# Altium footprint library ref-packages-longpad.PCBLIB: 1527 footprints (part 40 of 103)
Each footprint in its own frame and in the unit in brackets; x right, y up, seen from the top. Pads: shape width x height; smd on the part's side, far side on the other; paste and mask are expansions set on the pad; w line width, h text height; cw(c..) or ccw(c..) is an arc to the next point about the centre after c.
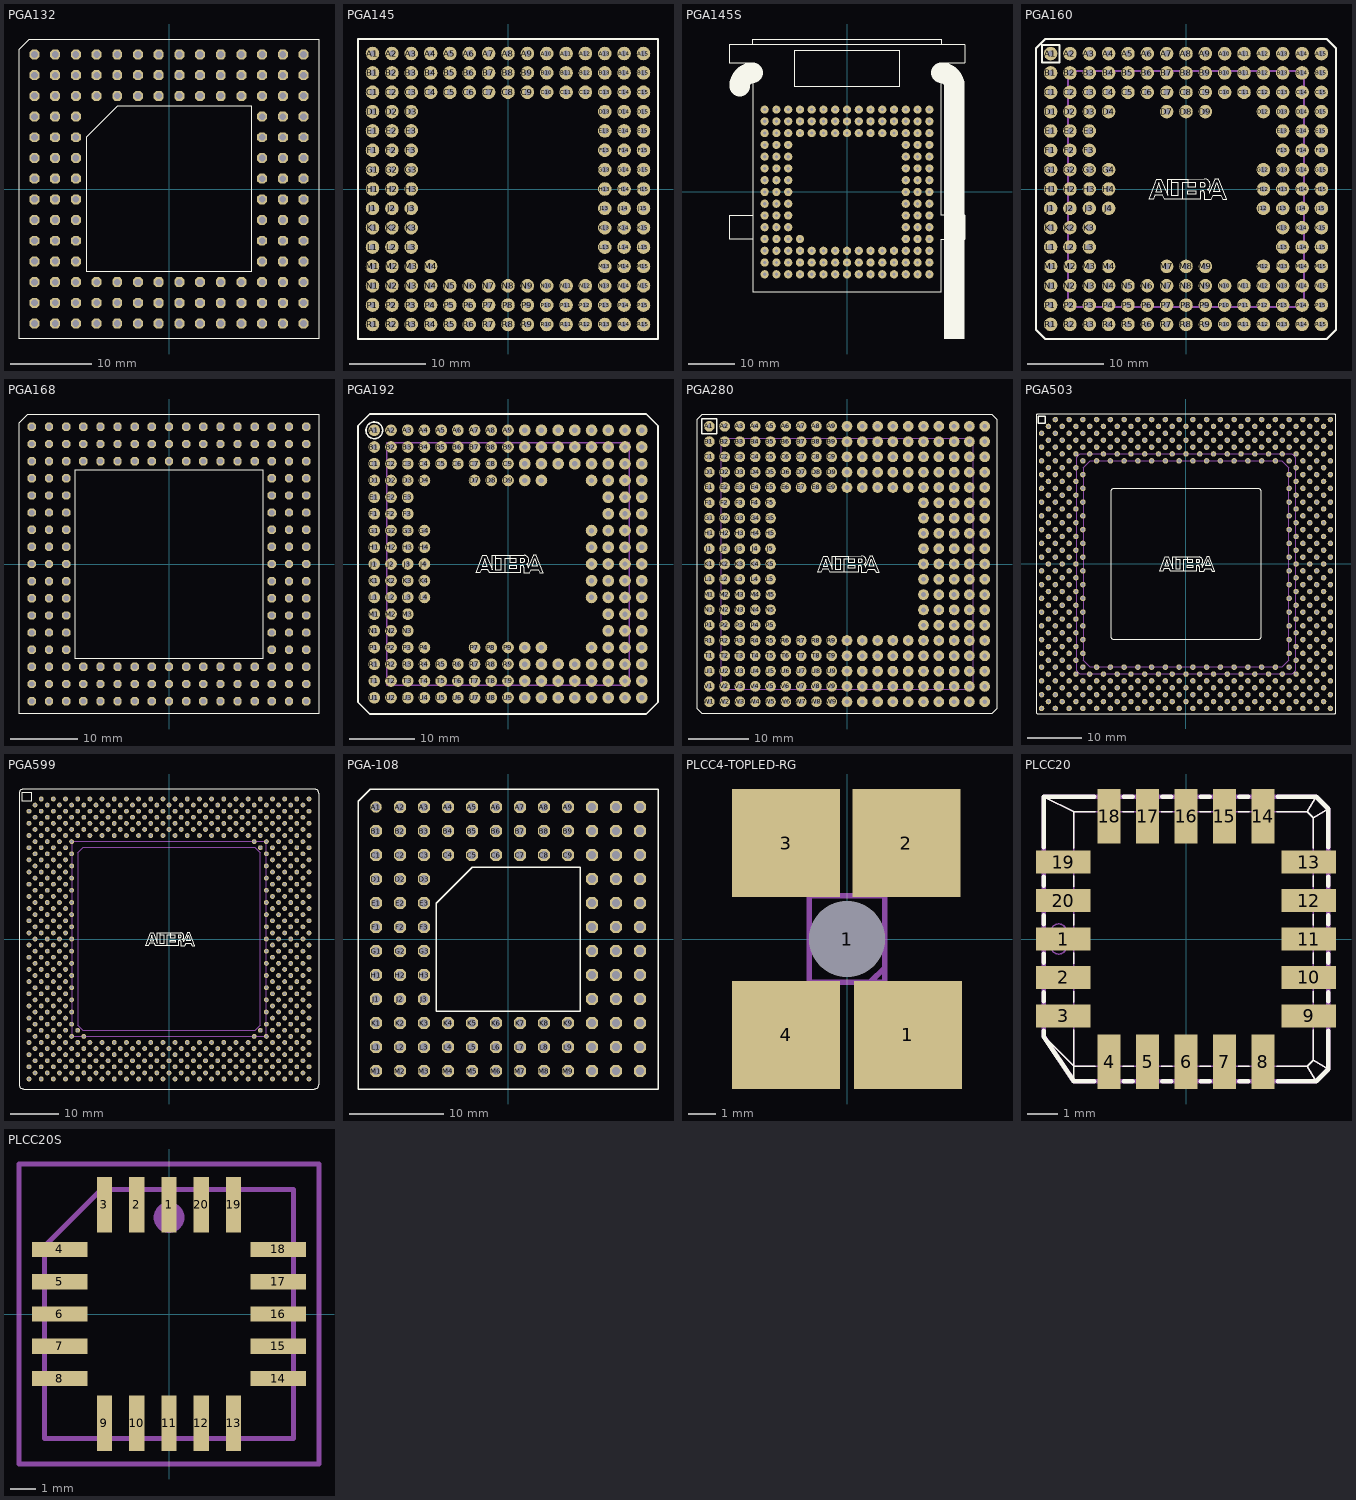
[diagram p39: the footprints below, top view; thin cyan lines are the x and y axes]

## PGA132 [mil]
pads (132):
  oct 48x48 hole 32: A01(-650,650) A02(-550,650) A03(-450,650) A04(-350,650) A05(-250,650) A06(-150,650) A07(-50,650) A08(50,650) A09(150,650) A10(250,650) A11(350,650) A12(450,650) A13(550,650) A14(650,650) B01(-650,550) B02(-550,550) B03(-450,550) B04(-350,550) B05(-250,550) B06(-150,550) B07(-50,550) B08(50,550) B09(150,550) B10(250,550) B11(350,550) B12(450,550) B13(550,550) B14(650,550) C01(-650,450) C02(-550,450) C03(-450,450) C04(-350,450) C05(-250,450) C06(-150,450) C07(-50,450) C08(50,450) C09(150,450) C10(250,450) C11(350,450) C12(450,450) C13(550,450) C14(650,450) D01(-650,350) D02(-550,350) D03(-450,350) D12(450,350) D13(550,350) D14(650,350) E01(-650,250) E02(-550,250) E03(-450,250) E12(450,250) E13(550,250) E14(650,250) F01(-650,150) F02(-550,150) F03(-450,150) F12(450,150) F13(550,150) F14(650,150) G01(-650,50) G02(-550,50) G03(-450,50) G12(450,50) G13(550,50) G14(650,50) H01(-650,-50) H02(-550,-50) H03(-450,-50) H12(450,-50) H13(550,-50) H14(650,-50) J01(-650,-150) J02(-550,-150) J03(-450,-150) J12(450,-150) J13(550,-150) J14(650,-150) K01(-650,-250) K02(-550,-250) K03(-450,-250) K12(450,-250) K13(550,-250) K14(650,-250) L01(-650,-350) L02(-550,-350) L03(-450,-350) L12(450,-350) L13(550,-350) L14(650,-350) M01(-650,-450) M02(-550,-450) M03(-450,-450) M04(-350,-450) M05(-250,-450) M06(-150,-450) M07(-50,-450) M08(50,-450) M09(150,-450) M10(250,-450) M11(350,-450) M12(450,-450) M13(550,-450) M14(650,-450) N01(-650,-550) N02(-550,-550) N03(-450,-550) N04(-350,-550) N05(-250,-550) N06(-150,-550) N07(-50,-550) N08(50,-550) N09(150,-550) N10(250,-550) N11(350,-550) N12(450,-550) N13(550,-550) N14(650,-550) P01(-650,-650) P02(-550,-650) P03(-450,-650) P04(-350,-650) P05(-250,-650) P06(-150,-650) P07(-50,-650) P08(50,-650) P09(150,-650) P10(250,-650) P11(350,-650) P12(450,-650) P13(550,-650) P14(650,-650)
Top Overlay:
  lines w6: -725,-725 725,-725 725,725 -675,725 -725,675 -725,-725 ; -400,-400 400,-400 400,400 -250,400 -400,250 -400,-400

## PGA145 [mil]
pads (145):
  round 70 hole 32: A1(-700,700) A2(-600,700) A3(-500,700) A4(-400,700) A5(-300,700) A6(-200,700) A7(-100,700) A8(0,700) A9(100,700) A10(200,700) A11(300,700) A12(400,700) A13(500,700) A14(600,700) A15(700,700) B1(-700,600) B2(-600,600) B3(-500,600) B4(-400,600) B5(-300,600) B6(-200,600) B7(-100,600) B8(0,600) B9(100,600) B10(200,600) B11(300,600) B12(400,600) B13(500,600) B14(600,600) B15(700,600) C1(-700,500) C2(-600,500) C3(-500,500) C4(-400,500) C5(-300,500) C6(-200,500) C7(-100,500) C8(0,500) C9(100,500) C10(200,500) C11(300,500) C12(400,500) C13(500,500) C14(600,500) C15(700,500) D1(-700,400) D2(-600,400) D3(-500,400) D13(500,400) D14(600,400) D15(700,400) E1(-700,300) E2(-600,300) E3(-500,300) E13(500,300) E14(600,300) E15(700,300) F1(-700,200) F2(-600,200) F3(-500,200) F13(500,200) F14(600,200) F15(700,200) G1(-700,100) G2(-600,100) G3(-500,100) G13(500,100) G14(600,100) G15(700,100) H1(-700,0) H2(-600,0) H3(-500,0) H13(500,0) H14(600,0) H15(700,0) J1(-700,-100) J2(-600,-100) J3(-500,-100) J13(500,-100) J14(600,-100) J15(700,-100) K1(-700,-200) K2(-600,-200) K3(-500,-200) K13(500,-200) K14(600,-200) K15(700,-200) L1(-700,-300) L2(-600,-300) L3(-500,-300) L13(500,-300) L14(600,-300) L15(700,-300) M1(-700,-400) M2(-600,-400) M3(-500,-400) M4(-400,-400) M13(500,-400) M14(600,-400) M15(700,-400) N1(-700,-500) N2(-600,-500) N3(-500,-500) N4(-400,-500) N5(-300,-500) N6(-200,-500) N7(-100,-500) N8(0,-500) N9(100,-500) N10(200,-500) N11(300,-500) N12(400,-500) N13(500,-500) N14(600,-500) N15(700,-500) P1(-700,-600) P2(-600,-600) P3(-500,-600) P4(-400,-600) P5(-300,-600) P6(-200,-600) P7(-100,-600) P8(0,-600) P9(100,-600) P10(200,-600) P11(300,-600) P12(400,-600) P13(500,-600) P14(600,-600) P15(700,-600) R1(-700,-700) R2(-600,-700) R3(-500,-700) R4(-400,-700) R5(-300,-700) R6(-200,-700) R7(-100,-700) R8(0,-700) R9(100,-700) R10(200,-700) R11(300,-700) R12(400,-700) R13(500,-700) R14(600,-700) R15(700,-700)
Top Overlay:
  lines w10: -775,-775 775,-775 775,775 -775,775 -775,-775

## PGA145S [mil]
pads (145):
  round 70 hole 27.56: A1(-700,700) A2(-600,700) A3(-500,700) A4(-400,700) A5(-300,700) A6(-200,700) A7(-100,700) A8(0,700) A9(100,700) A10(200,700) A11(300,700) A12(400,700) A13(500,700) A14(600,700) A15(700,700) B1(-700,600) B2(-600,600) B3(-500,600) B4(-400,600) B5(-300,600) B6(-200,600) B7(-100,600) B8(0,600) B9(100,600) B10(200,600) B11(300,600) B12(400,600) B13(500,600) B14(600,600) B15(700,600) C1(-700,500) C2(-600,500) C3(-500,500) C4(-400,500) C5(-300,500) C6(-200,500) C7(-100,500) C8(0,500) C9(100,500) C10(200,500) C11(300,500) C12(400,500) C13(500,500) C14(600,500) C15(700,500) D1(-700,400) D2(-600,400) D3(-500,400) D13(500,400) D14(600,400) D15(700,400) E1(-700,300) E2(-600,300) E3(-500,300) E13(500,300) E14(600,300) E15(700,300) F1(-700,200) F2(-600,200) F3(-500,200) F13(500,200) F14(600,200) F15(700,200) G1(-700,100) G2(-600,100) G3(-500,100) G13(500,100) G14(600,100) G15(700,100) H1(-700,0) H2(-600,0) H3(-500,0) H13(500,0) H14(600,0) H15(700,0) J1(-700,-100) J2(-600,-100) J3(-500,-100) J13(500,-100) J14(600,-100) J15(700,-100) K1(-700,-200) K2(-600,-200) K3(-500,-200) K13(500,-200) K14(600,-200) K15(700,-200) L1(-700,-300) L2(-600,-300) L3(-500,-300) L13(500,-300) L14(600,-300) L15(700,-300) M1(-700,-400) M2(-600,-400) M3(-500,-400) M4(-400,-400) M13(500,-400) M14(600,-400) M15(700,-400) N1(-700,-500) N2(-600,-500) N3(-500,-500) N4(-400,-500) N5(-300,-500) N6(-200,-500) N7(-100,-500) N8(0,-500) N9(100,-500) N10(200,-500) N11(300,-500) N12(400,-500) N13(500,-500) N14(600,-500) N15(700,-500) P1(-700,-600) P2(-600,-600) P3(-500,-600) P4(-400,-600) P5(-300,-600) P6(-200,-600) P7(-100,-600) P8(0,-600) P9(100,-600) P10(200,-600) P11(300,-600) P12(400,-600) P13(500,-600) P14(600,-600) P15(700,-600) R1(-700,-700) R2(-600,-700) R3(-500,-700) R4(-400,-700) R5(-300,-700) R6(-200,-700) R7(-100,-700) R8(0,-700) R9(100,-700) R10(200,-700) R11(300,-700) R12(400,-700) R13(500,-700) R14(600,-700) R15(700,-700)
Top Overlay:
  rectangle: 825,-1250 1000,925
  lines w10: -800,-400 -1000,-400 -1000,-200 -800,-200 ; -800,-400 -800,-850 800,-850 800,-400 1000,-400 1000,-200 800,-200 800,1012.5 800,1100 1000,1100 1000,1250 800,1250 ; -800,-400 -800,-200 ; -800,-200 -800,1012.5 -800,1100 -1000,1100 -1000,1250 -800,1250 ; -800,1250 800,1250 ; -800,1250 -800,1300 800,1300 800,1250 ; -450,900 -450,1200 450,1200 450,900 -450,900
  lines w175: -912.5,900 cw(c-800,900) -800,1012.5 ; 800,1012.5 cw(c800,900) 912.5,900

## PGA160 [mil]
pads (160):
  round 70 hole 32: A1(-700,700) A2(-600,700) A3(-500,700) A4(-400,700) A5(-300,700) A6(-200,700) A7(-100,700) A8(0,700) A9(100,700) A10(200,700) A11(300,700) A12(400,700) A13(500,700) A14(600,700) A15(700,700) B1(-700,600) B2(-600,600) B3(-500,600) B4(-400,600) B5(-300,600) B6(-200,600) B7(-100,600) B8(0,600) B9(100,600) B10(200,600) B11(300,600) B12(400,600) B13(500,600) B14(600,600) B15(700,600) C1(-700,500) C2(-600,500) C3(-500,500) C4(-400,500) C5(-300,500) C6(-200,500) C7(-100,500) C8(0,500) C9(100,500) C10(200,500) C11(300,500) C12(400,500) C13(500,500) C14(600,500) C15(700,500) D1(-700,400) D2(-600,400) D3(-500,400) D4(-400,400) D7(-100,400) D8(0,400) D9(100,400) D12(400,400) D13(500,400) D14(600,400) D15(700,400) E1(-700,300) E2(-600,300) E3(-500,300) E13(500,300) E14(600,300) E15(700,300) F1(-700,200) F2(-600,200) F3(-500,200) F13(500,200) F14(600,200) F15(700,200) G1(-700,100) G2(-600,100) G3(-500,100) G4(-400,100) G12(400,100) G13(500,100) G14(600,100) G15(700,100) H1(-700,0) H2(-600,0) H3(-500,0) H4(-400,0) H12(400,0) H13(500,0) H14(600,0) H15(700,0) J1(-700,-100) J2(-600,-100) J3(-500,-100) J4(-400,-100) J12(400,-100) J13(500,-100) J14(600,-100) J15(700,-100) K1(-700,-200) K2(-600,-200) K3(-500,-200) K13(500,-200) K14(600,-200) K15(700,-200) L1(-700,-300) L2(-600,-300) L3(-500,-300) L13(500,-300) L14(600,-300) L15(700,-300) M1(-700,-400) M2(-600,-400) M3(-500,-400) M4(-400,-400) M7(-100,-400) M8(0,-400) M9(100,-400) M12(400,-400) M13(500,-400) M14(600,-400) M15(700,-400) N1(-700,-500) N2(-600,-500) N3(-500,-500) N4(-400,-500) N5(-300,-500) N6(-200,-500) N7(-100,-500) N8(0,-500) N9(100,-500) N10(200,-500) N11(300,-500) N12(400,-500) N13(500,-500) N14(600,-500) N15(700,-500) P1(-700,-600) P2(-600,-600) P3(-500,-600) P4(-400,-600) P5(-300,-600) P6(-200,-600) P7(-100,-600) P8(0,-600) P9(100,-600) P10(200,-600) P11(300,-600) P12(400,-600) P13(500,-600) P14(600,-600) P15(700,-600) R1(-700,-700) R2(-600,-700) R3(-500,-700) R4(-400,-700) R5(-300,-700) R6(-200,-700) R7(-100,-700) R8(0,-700) R9(100,-700) R10(200,-700) R11(300,-700) R12(400,-700) R13(500,-700) R14(600,-700) R15(700,-700)
Top Overlay:
  lines w6: -15.32,-53.43 74.69,-53.43 74.69,-8.43 84.69,-8.43 cw(c84.69,-18.43) 94.69,-18.43 94.69,-53.43 129.69,-53.43 139.69,-33.43 179.69,-33.43 189.69,-53.43 209.69,-53.43 169.69,51.57 149.69,51.57 119.69,-18.43 ; 112.37,-2.09 cw(c104.87,-18.33) 122.36,-22.09 ; 112.58,-2.65 ccw(c95.08,22.13) 97.58,52.36 9.69,51.57 ; -75.32,31.57 -75.32,51.57 ; -75.32,31.57 -75.32,-33.43 -40.32,-33.43 -40.32,31.57 -75.32,31.57 ; -75.32,51.57 -95.32,51.57 -95.32,-33.43 -130.32,51.57 -150.32,51.57 -190.32,-53.43 -170.32,-53.43 -160.32,-33.43 -120.32,-33.43 -110.32,-53.43 -20.32,-53.43 -20.32,31.57 9.69,31.57 ; -75.32,51.57 9.69,51.57 ; 9.69,31.57 9.69,51.57 ; 9.69,31.57 9.69,11.57 49.69,11.57 49.69,31.57 9.69,31.57 ; -155.32,-13.43 -140.32,31.57 -125.32,-13.43 -155.32,-13.43 ; 9.69,-28.43 49.69,-28.43 49.69,-8.43 9.69,-8.43 9.69,-28.43 ; 74.69,11.57 74.69,31.57 89.69,31.57 cw(c89.69,21.57) 89.69,11.57 74.69,11.57 ; 144.69,-13.43 174.69,-13.43 159.69,31.57 144.69,-13.43
  lines w10: -775.59,-728.66 -728.66,-775.59 728.66,-775.59 775.59,-728.66 775.59,728.66 728.66,775.59 -728.66,775.59 -775.59,728.66 -775.59,-728.66 ; -745,655 -655,655 -655,745 -745,745 -745,655
Mechanical 16:
  lines w10: -610.24,-610.24 610.24,-610.24 610.24,610.24 -610.24,610.24 -610.24,-610.24
  text "PGA160" at -110.63,-128.74 h49.6

## PGA168 [mil]
pads (168):
  oct 48x48 hole 32: A01(-800,800) A02(-700,800) A03(-600,800) A04(-500,800) A05(-400,800) A06(-300,800) A07(-200,800) A08(-100,800) A09(0,800) A10(100,800) A11(200,800) A12(300,800) A13(400,800) A14(500,800) A15(600,800) A16(700,800) A17(800,800) B01(-800,700) B02(-700,700) B03(-600,700) B04(-500,700) B05(-400,700) B06(-300,700) B07(-200,700) B08(-100,700) B09(0,700) B10(100,700) B11(200,700) B12(300,700) B13(400,700) B14(500,700) B15(600,700) B16(700,700) B17(800,700) C01(-800,600) C02(-700,600) C03(-600,600) C04(-500,600) C05(-400,600) C06(-300,600) C07(-200,600) C08(-100,600) C09(0,600) C10(100,600) C11(200,600) C12(300,600) C13(400,600) C14(500,600) C15(600,600) C16(700,600) C17(800,600) D01(-800,500) D02(-700,500) D03(-600,500) D15(600,500) D16(700,500) D17(800,500) E01(-800,400) E02(-700,400) E03(-600,400) E15(600,400) E16(700,400) E17(800,400) F01(-800,300) F02(-700,300) F03(-600,300) F15(600,300) F16(700,300) F17(800,300) G01(-800,200) G02(-700,200) G03(-600,200) G15(600,200) G16(700,200) G17(800,200) H01(-800,100) H02(-700,100) H03(-600,100) H15(600,100) H16(700,100) H17(800,100) J01(-800,0) J02(-700,0) J03(-600,0) J15(600,0) J16(700,0) J17(800,0) K01(-800,-100) K02(-700,-100) K03(-600,-100) K15(600,-100) K16(700,-100) K17(800,-100) L01(-800,-200) L02(-700,-200) L03(-600,-200) L15(600,-200) L16(700,-200) L17(800,-200) M01(-800,-300) M02(-700,-300) M03(-600,-300) M15(600,-300) M16(700,-300) M17(800,-300) N01(-800,-400) N02(-700,-400) N03(-600,-400) N15(600,-400) N16(700,-400) N17(800,-400) P01(-800,-500) P02(-700,-500) P03(-600,-500) P15(600,-500) P16(700,-500) P17(800,-500) Q01(-800,-600) Q02(-700,-600) Q03(-600,-600) Q04(-500,-600) Q05(-400,-600) Q06(-300,-600) Q07(-200,-600) Q08(-100,-600) Q09(0,-600) Q10(100,-600) Q11(200,-600) Q12(300,-600) Q13(400,-600) Q14(500,-600) Q15(600,-600) Q16(700,-600) Q17(800,-600) R01(-800,-700) R02(-700,-700) R03(-600,-700) R04(-500,-700) R05(-400,-700) R06(-300,-700) R07(-200,-700) R08(-100,-700) R09(0,-700) R10(100,-700) R11(200,-700) R12(300,-700) R13(400,-700) R14(500,-700) R15(600,-700) R16(700,-700) R17(800,-700) S01(-800,-800) S02(-700,-800) S03(-600,-800) S04(-500,-800) S05(-400,-800) S06(-300,-800) S07(-200,-800) S08(-100,-800) S09(0,-800) S10(100,-800) S11(200,-800) S12(300,-800) S13(400,-800) S14(500,-800) S15(600,-800) S16(700,-800) S17(800,-800)
Top Overlay:
  lines w6: -875,-875 875,-875 875,875 -825,875 -875,825 -875,-875 ; -550,-550 550,-550 550,550 -550,550 -550,-550

## PGA192 [mil]
pads (192):
  round 70 hole 32: A1(-800,800) A2(-700,800) A3(-600,800) A4(-500,800) A5(-400,800) A6(-300,800) A7(-200,800) A8(-100,800) A9(0,800) A10(100,800) A11(200,800) A12(300,800) A13(400,800) A14(500,800) A15(600,800) A16(700,800) A17(800,800) B1(-800,700) B2(-700,700) B3(-600,700) B4(-500,700) B5(-400,700) B6(-300,700) B7(-200,700) B8(-100,700) B9(0,700) B10(100,700) B11(200,700) B12(300,700) B13(400,700) B14(500,700) B15(600,700) B16(700,700) B17(800,700) C1(-800,600) C2(-700,600) C3(-600,600) C4(-500,600) C5(-400,600) C6(-300,600) C7(-200,600) C8(-100,600) C9(0,600) C10(100,600) C11(200,600) C12(300,600) C13(400,600) C14(500,600) C15(600,600) C16(700,600) C17(800,600) D1(-800,500) D2(-700,500) D3(-600,500) D4(-500,500) D7(-200,500) D8(-100,500) D9(0,500) D10(100,500) D11(200,500) D14(500,500) D15(600,500) D16(700,500) D17(800,500) E1(-800,400) E2(-700,400) E3(-600,400) E15(600,400) E16(700,400) E17(800,400) F1(-800,300) F2(-700,300) F3(-600,300) F15(600,300) F16(700,300) F17(800,300) G1(-800,200) G2(-700,200) G3(-600,200) G4(-500,200) G14(500,200) G15(600,200) G16(700,200) G17(800,200) H1(-800,100) H2(-700,100) H3(-600,100) H4(-500,100) H14(500,100) H15(600,100) H16(700,100) H17(800,100) J1(-800,0) J2(-700,0) J3(-600,0) J4(-500,0) J14(500,0) J15(600,0) J16(700,0) J17(800,0) K1(-800,-100) K2(-700,-100) K3(-600,-100) K4(-500,-100) K14(500,-100) K15(600,-100) K16(700,-100) K17(800,-100) L1(-800,-200) L2(-700,-200) L3(-600,-200) L4(-500,-200) L14(500,-200) L15(600,-200) L16(700,-200) L17(800,-200) M1(-800,-300) M2(-700,-300) M3(-600,-300) M15(600,-300) M16(700,-300) M17(800,-300) N1(-800,-400) N2(-700,-400) N3(-600,-400) N15(600,-400) N16(700,-400) N17(800,-400) P1(-800,-500) P2(-700,-500) P3(-600,-500) P4(-500,-500) P7(-200,-500) P8(-100,-500) P9(0,-500) P10(100,-500) P11(200,-500) P14(500,-500) P15(600,-500) P16(700,-500) P17(800,-500) R1(-800,-600) R2(-700,-600) R3(-600,-600) R4(-500,-600) R5(-400,-600) R6(-300,-600) R7(-200,-600) R8(-100,-600) R9(0,-600) R10(100,-600) R11(200,-600) R12(300,-600) R13(400,-600) R14(500,-600) R15(600,-600) R16(700,-600) R17(800,-600) T1(-800,-700) T2(-700,-700) T3(-600,-700) T4(-500,-700) T5(-400,-700) T6(-300,-700) T7(-200,-700) T8(-100,-700) T9(0,-700) T10(100,-700) T11(200,-700) T12(300,-700) T13(400,-700) T14(500,-700) T15(600,-700) T16(700,-700) T17(800,-700) U1(-800,-800) U2(-700,-800) U3(-600,-800) U4(-500,-800) U5(-400,-800) U6(-300,-800) U7(-200,-800) U8(-100,-800) U9(0,-800) U10(100,-800) U11(200,-800) U12(300,-800) U13(400,-800) U14(500,-800) U15(600,-800) U16(700,-800) U17(800,-800)
Top Overlay:
  circle w10: c-800,800 r50
  lines w6: -15.32,-53.43 74.69,-53.43 74.69,-8.43 84.69,-8.43 cw(c84.69,-18.43) 94.69,-18.43 94.69,-53.43 129.69,-53.43 139.69,-33.43 179.69,-33.43 189.69,-53.43 209.69,-53.43 169.69,51.57 149.69,51.57 119.69,-18.43 ; 112.37,-2.09 cw(c104.87,-18.33) 122.36,-22.09 ; 112.58,-2.65 ccw(c95.08,22.13) 97.58,52.36 9.69,51.57 ; -75.32,31.57 -75.32,51.57 ; -75.32,31.57 -75.32,-33.43 -40.32,-33.43 -40.32,31.57 -75.32,31.57 ; -75.32,51.57 -95.32,51.57 -95.32,-33.43 -130.32,51.57 -150.32,51.57 -190.32,-53.43 -170.32,-53.43 -160.32,-33.43 -120.32,-33.43 -110.32,-53.43 -20.32,-53.43 -20.32,31.57 9.69,31.57 ; -75.32,51.57 9.69,51.57 ; 9.69,31.57 9.69,51.57 ; 9.69,31.57 9.69,11.57 49.69,11.57 49.69,31.57 9.69,31.57 ; -155.32,-13.43 -140.32,31.57 -125.32,-13.43 -155.32,-13.43 ; 9.69,-28.43 49.69,-28.43 49.69,-8.43 9.69,-8.43 9.69,-28.43 ; 74.69,11.57 74.69,31.57 89.69,31.57 cw(c89.69,21.57) 89.69,11.57 74.69,11.57 ; 144.69,-13.43 174.69,-13.43 159.69,31.57 144.69,-13.43
  lines w10: -897.64,-826.77 -826.77,-897.64 826.77,-897.64 897.64,-826.77 897.64,826.77 826.77,897.64 -826.77,897.64 -897.64,826.77 -897.64,-826.77
Mechanical 16:
  lines w10: -725,-725 -725,725 725,725 725,-725 -725,-725
  text "PGA192" at -110.63,-128.74 h49.6

## PGA280 [mil]
pads (280):
  round 70 hole 32: A1(-900,900) A2(-800,900) A3(-700,900) A4(-600,900) A5(-500,900) A6(-400,900) A7(-300,900) A8(-200,900) A9(-100,900) A10(0,900) A11(100,900) A12(200,900) A13(300,900) A14(400,900) A15(500,900) A16(600,900) A17(700,900) A18(800,900) A19(900,900) B1(-900,800) B2(-800,800) B3(-700,800) B4(-600,800) B5(-500,800) B6(-400,800) B7(-300,800) B8(-200,800) B9(-100,800) B10(0,800) B11(100,800) B12(200,800) B13(300,800) B14(400,800) B15(500,800) B16(600,800) B17(700,800) B18(800,800) B19(900,800) C1(-900,700) C2(-800,700) C3(-700,700) C4(-600,700) C5(-500,700) C6(-400,700) C7(-300,700) C8(-200,700) C9(-100,700) C10(0,700) C11(100,700) C12(200,700) C13(300,700) C14(400,700) C15(500,700) C16(600,700) C17(700,700) C18(800,700) C19(900,700) D1(-900,600) D2(-800,600) D3(-700,600) D4(-600,600) D5(-500,600) D6(-400,600) D7(-300,600) D8(-200,600) D9(-100,600) D10(0,600) D11(100,600) D12(200,600) D13(300,600) D14(400,600) D15(500,600) D16(600,600) D17(700,600) D18(800,600) D19(900,600) E1(-900,500) E2(-800,500) E3(-700,500) E4(-600,500) E5(-500,500) E6(-400,500) E7(-300,500) E8(-200,500) E9(-100,500) E10(0,500) E11(100,500) E12(200,500) E13(300,500) E14(400,500) E15(500,500) E16(600,500) E17(700,500) E18(800,500) E19(900,500) F1(-900,400) F2(-800,400) F3(-700,400) F4(-600,400) F5(-500,400) F15(500,400) F16(600,400) F17(700,400) F18(800,400) F19(900,400) G1(-900,300) G2(-800,300) G3(-700,300) G4(-600,300) G5(-500,300) G15(500,300) G16(600,300) G17(700,300) G18(800,300) G19(900,300) H1(-900,200) H2(-800,200) H3(-700,200) H4(-600,200) H5(-500,200) H15(500,200) H16(600,200) H17(700,200) H18(800,200) H19(900,200) J1(-900,100) J2(-800,100) J3(-700,100) J4(-600,100) J5(-500,100) J15(500,100) J16(600,100) J17(700,100) J18(800,100) J19(900,100) K1(-900,0) K2(-800,0) K3(-700,0) K4(-600,0) K5(-500,0) K15(500,0) K16(600,0) K17(700,0) K18(800,0) K19(900,0) L1(-900,-100) L2(-800,-100) L3(-700,-100) L4(-600,-100) L5(-500,-100) L15(500,-100) L16(600,-100) L17(700,-100) L18(800,-100) L19(900,-100) M1(-900,-200) M2(-800,-200) M3(-700,-200) M4(-600,-200) M5(-500,-200) M15(500,-200) M16(600,-200) M17(700,-200) M18(800,-200) M19(900,-200) N1(-900,-300) N2(-800,-300) N3(-700,-300) N4(-600,-300) N5(-500,-300) N15(500,-300) N16(600,-300) N17(700,-300) N18(800,-300) N19(900,-300) P1(-900,-400) P2(-800,-400) P3(-700,-400) P4(-600,-400) P5(-500,-400) P15(500,-400) P16(600,-400) P17(700,-400) P18(800,-400) P19(900,-400) R1(-900,-500) R2(-800,-500) R3(-700,-500) R4(-600,-500) R5(-500,-500) R6(-400,-500) R7(-300,-500) R8(-200,-500) R9(-100,-500) R10(0,-500) R11(100,-500) R12(200,-500) R13(300,-500) R14(400,-500) R15(500,-500) R16(600,-500) R17(700,-500) R18(800,-500) R19(900,-500) T1(-900,-600) T2(-800,-600) T3(-700,-600) T4(-600,-600) T5(-500,-600) T6(-400,-600) T7(-300,-600) T8(-200,-600) T9(-100,-600) T10(0,-600) T11(100,-600) T12(200,-600) T13(300,-600) T14(400,-600) T15(500,-600) T16(600,-600) T17(700,-600) T18(800,-600) T19(900,-600) U1(-900,-700) U2(-800,-700) U3(-700,-700) U4(-600,-700) U5(-500,-700) U6(-400,-700) U7(-300,-700) U8(-200,-700) U9(-100,-700) U10(0,-700) U11(100,-700) U12(200,-700) U13(300,-700) U14(400,-700) U15(500,-700) U16(600,-700) U17(700,-700) U18(800,-700) U19(900,-700) V1(-900,-800) V2(-800,-800) V3(-700,-800) V4(-600,-800) V5(-500,-800) V6(-400,-800) V7(-300,-800) V8(-200,-800) V9(-100,-800) V10(0,-800) V11(100,-800) V12(200,-800) V13(300,-800) V14(400,-800) V15(500,-800) V16(600,-800) V17(700,-800) V18(800,-800) V19(900,-800) W1(-900,-900) W2(-800,-900) W3(-700,-900) W4(-600,-900) W5(-500,-900) W6(-400,-900) W7(-300,-900) W8(-200,-900) W9(-100,-900) W10(0,-900) W11(100,-900) W12(200,-900) W13(300,-900) W14(400,-900) W15(500,-900) W16(600,-900) W17(700,-900) W18(800,-900) W19(900,-900)
Top Overlay:
  lines w6: -15.32,-53.43 74.69,-53.43 74.69,-8.43 84.69,-8.43 cw(c84.69,-18.43) 94.69,-18.43 94.69,-53.43 129.69,-53.43 139.69,-33.43 179.69,-33.43 189.69,-53.43 209.69,-53.43 169.69,51.57 149.69,51.57 119.69,-18.43 ; 112.37,-2.09 cw(c104.87,-18.33) 122.36,-22.09 ; 112.58,-2.65 ccw(c95.08,22.13) 97.58,52.36 9.69,51.57 ; -75.32,31.57 -75.32,51.57 ; -75.32,31.57 -75.32,-33.43 -40.32,-33.43 -40.32,31.57 -75.32,31.57 ; -75.32,51.57 -95.32,51.57 -95.32,-33.43 -130.32,51.57 -150.32,51.57 -190.32,-53.43 -170.32,-53.43 -160.32,-33.43 -120.32,-33.43 -110.32,-53.43 -20.32,-53.43 -20.32,31.57 9.69,31.57 ; -75.32,51.57 9.69,51.57 ; 9.69,31.57 9.69,51.57 ; 9.69,31.57 9.69,11.57 49.69,11.57 49.69,31.57 9.69,31.57 ; -155.32,-13.43 -140.32,31.57 -125.32,-13.43 -155.32,-13.43 ; 9.69,-28.43 49.69,-28.43 49.69,-8.43 9.69,-8.43 9.69,-28.43 ; 74.69,11.57 74.69,31.57 89.69,31.57 cw(c89.69,21.57) 89.69,11.57 74.69,11.57 ; 144.69,-13.43 174.69,-13.43 159.69,31.57 144.69,-13.43
  lines w8: -980.32,-944.88 -944.88,-980.32 944.88,-980.32 980.32,-944.88 980.32,944.88 944.88,980.32 -944.88,980.32 -980.32,944.88 -980.32,-944.88
  lines w10: -950,850 -950,950 -850,950 -850,850 -950,850
Mechanical 16:
  lines w8: -822.83,-822.83 822.83,-822.83 822.83,822.83 -822.83,822.83 -822.83,-822.83
  text "PGA280" at -110.63,-128.74 h49.6

## PGA503 [mil]
pads (503):
  round 40 hole 24: A3(-950,1050) A5(-850,1050) A7(-750,1050) A9(-650,1050) A11(-550,1050) A13(-450,1050) A15(-350,1050) A17(-250,1050) A19(-150,1050) A21(-50,1050) A23(50,1050) A25(150,1050) A27(250,1050) A29(350,1050) A31(450,1050) A33(550,1050) A35(650,1050) A37(750,1050) A39(850,1050) A41(950,1050) A43(1050,1050) AA1(-1050,50) AA3(-950,50) AA5(-850,50) AA7(-750,50) AA37(750,50) AA39(850,50) AA41(950,50) AA43(1050,50) AB2(-1000,0) AB4(-900,0) AB6(-800,0) AB38(800,0) AB40(900,0) AB42(1000,0) AC1(-1050,-50) AC3(-950,-50) AC5(-850,-50) AC7(-750,-50) AC37(750,-50) AC39(850,-50) AC41(950,-50) AC43(1050,-50) AD2(-1000,-100) AD4(-900,-100) AD6(-800,-100) AD38(800,-100) AD40(900,-100) AD42(1000,-100) AE1(-1050,-150) AE3(-950,-150) AE5(-850,-150) AE7(-750,-150) AE37(750,-150) AE39(850,-150) AE41(950,-150) AE43(1050,-150) AF2(-1000,-200) AF4(-900,-200) AF6(-800,-200) AF38(800,-200) AF40(900,-200) AF42(1000,-200) AG1(-1050,-250) AG3(-950,-250) AG5(-850,-250) AG7(-750,-250) AG37(750,-250) AG39(850,-250) AG41(950,-250) AG43(1050,-250) AH2(-1000,-300) AH4(-900,-300) AH6(-800,-300) AH38(800,-300) AH40(900,-300) AH42(1000,-300) AJ1(-1050,-350) AJ3(-950,-350) AJ5(-850,-350) AJ7(-750,-350) AJ37(750,-350) AJ39(850,-350) AJ41(950,-350) AJ43(1050,-350) AK2(-1000,-400) AK4(-900,-400) AK6(-800,-400) AK38(800,-400) AK40(900,-400) AK42(1000,-400) AL1(-1050,-450) AL3(-950,-450) AL5(-850,-450) AL7(-750,-450) AL37(750,-450) AL39(850,-450) AL41(950,-450) AL43(1050,-450) AM2(-1000,-500) AM4(-900,-500) AM6(-800,-500) AM38(800,-500) AM40(900,-500) AM42(1000,-500) AN1(-1050,-550) AN3(-950,-550) AN5(-850,-550) AN7(-750,-550) AN37(750,-550) AN39(850,-550) AN41(950,-550) AN43(1050,-550) AP2(-1000,-600) AP4(-900,-600) AP6(-800,-600) AP38(800,-600) AP40(900,-600) AP42(1000,-600) AR1(-1050,-650) AR3(-950,-650) AR5(-850,-650) AR7(-750,-650) AR37(750,-650) AR39(850,-650) AR41(950,-650) AR43(1050,-650) AT2(-1000,-700) AT4(-900,-700) AT6(-800,-700) AT38(800,-700) AT40(900,-700) AT42(1000,-700) AU1(-1050,-750) AU3(-950,-750) AU5(-850,-750) AU7(-750,-750) AU9(-650,-750) AU11(-550,-750) AU13(-450,-750) AU15(-350,-750) AU17(-250,-750) AU19(-150,-750) AU21(-50,-750) AU23(50,-750) AU25(150,-750) AU27(250,-750) AU29(350,-750) AU31(450,-750) AU33(550,-750) AU35(650,-750) AU37(750,-750) AU39(850,-750) AU41(950,-750) AU43(1050,-750) AV2(-1000,-800) AV4(-900,-800) AV6(-800,-800) AV8(-700,-800) AV10(-600,-800) AV12(-500,-800) AV14(-400,-800) AV16(-300,-800) AV18(-200,-800) AV20(-100,-800) AV22(0,-800) AV24(100,-800) AV26(200,-800) AV28(300,-800) AV30(400,-800) AV32(500,-800) AV34(600,-800) AV36(700,-800) AV38(800,-800) AV40(900,-800) AV42(1000,-800) AW1(-1050,-850) AW3(-950,-850) AW5(-850,-850) AW7(-750,-850) AW9(-650,-850) AW11(-550,-850) AW13(-450,-850) AW15(-350,-850) AW17(-250,-850) AW19(-150,-850) AW21(-50,-850) AW23(50,-850) AW25(150,-850) AW27(250,-850) AW29(350,-850) AW31(450,-850) AW33(550,-850) AW35(650,-850) AW37(750,-850) AW39(850,-850) AW41(950,-850) AW43(1050,-850) AY2(-1000,-900) AY4(-900,-900) AY6(-800,-900) AY8(-700,-900) AY10(-600,-900) AY12(-500,-900) AY14(-400,-900) AY16(-300,-900) AY18(-200,-900) AY20(-100,-900) AY22(0,-900) AY24(100,-900) AY26(200,-900) AY28(300,-900) AY30(400,-900) AY32(500,-900) AY34(600,-900) AY36(700,-900) AY38(800,-900) AY40(900,-900) AY42(1000,-900) B2(-1000,1000) B4(-900,1000) B6(-800,1000) B8(-700,1000) B10(-600,1000) B12(-500,1000) B14(-400,1000) B16(-300,1000) B18(-200,1000) B20(-100,1000) B22(0,1000) B24(100,1000) B26(200,1000) B28(300,1000) B30(400,1000) B32(500,1000) B34(600,1000) B36(700,1000) B38(800,1000) B40(900,1000) B42(1000,1000) BA1(-1050,-950) BA3(-950,-950) BA5(-850,-950) BA7(-750,-950) BA9(-650,-950) BA11(-550,-950) BA13(-450,-950) BA15(-350,-950) BA17(-250,-950) BA19(-150,-950) BA21(-50,-950) BA23(50,-950) BA25(150,-950) BA27(250,-950) BA29(350,-950) BA31(450,-950) BA33(550,-950) BA35(650,-950) BA37(750,-950) BA39(850,-950) BA41(950,-950) BA43(1050,-950) BB2(-1000,-1000) BB4(-900,-1000) BB6(-800,-1000) BB8(-700,-1000) BB10(-600,-1000) BB12(-500,-1000) BB14(-400,-1000) BB16(-300,-1000) BB18(-200,-1000) BB20(-100,-1000) BB22(0,-1000) BB24(100,-1000) BB26(200,-1000) BB28(300,-1000) BB30(400,-1000) BB32(500,-1000) BB34(600,-1000) BB36(700,-1000) BB38(800,-1000) BB40(900,-1000) BB42(1000,-1000) BC1(-1050,-1050) BC3(-950,-1050) BC5(-850,-1050) BC7(-750,-1050) BC9(-650,-1050) BC11(-550,-1050) BC13(-450,-1050) BC15(-350,-1050) BC17(-250,-1050) BC19(-150,-1050) BC21(-50,-1050) BC23(50,-1050) BC25(150,-1050) BC27(250,-1050) BC29(350,-1050) BC31(450,-1050) BC33(550,-1050) BC35(650,-1050) BC37(750,-1050) BC39(850,-1050) BC41(950,-1050) BC43(1050,-1050) C1(-1050,950) C3(-950,950) C5(-850,950) C7(-750,950) C9(-650,950) C11(-550,950) C13(-450,950) C15(-350,950) C17(-250,950) C19(-150,950) C21(-50,950) C23(50,950) C25(150,950) C27(250,950) C29(350,950) C31(450,950) C33(550,950) C35(650,950) C37(750,950) C39(850,950) C41(950,950) C43(1050,950) D2(-1000,900) D4(-900,900) D6(-800,900) D8(-700,900) D10(-600,900) D12(-500,900) D14(-400,900) D16(-300,900) D18(-200,900) D20(-100,900) D22(0,900) D24(100,900) D26(200,900) D28(300,900) D30(400,900) D32(500,900) D34(600,900) D36(700,900) D38(800,900) D40(900,900) D42(1000,900) E1(-1050,850) E3(-950,850) E5(-850,850) E7(-750,850) E9(-650,850) E11(-550,850) E13(-450,850) E15(-350,850) E17(-250,850) E19(-150,850) E21(-50,850) E23(50,850) E25(150,850) E27(250,850) E29(350,850) E31(450,850) E33(550,850) E35(650,850) E37(750,850) E39(850,850) E41(950,850) E43(1050,850) F2(-1000,800) F4(-900,800) F6(-800,800) F8(-700,800) F10(-600,800) F12(-500,800) F14(-400,800) F16(-300,800) F18(-200,800) F20(-100,800) F22(0,800) F24(100,800) F26(200,800) F28(300,800) F30(400,800) F32(500,800) F34(600,800) F36(700,800) F38(800,800) F40(900,800) F42(1000,800) G1(-1050,750) G3(-950,750) G5(-850,750) G7(-750,750) G9(-650,750) G11(-550,750) G13(-450,750) G15(-350,750) G17(-250,750) G19(-150,750) G21(-50,750) G23(50,750) G25(150,750) G27(250,750) G29(350,750) G31(450,750) G33(550,750) G35(650,750) G37(750,750) G39(850,750) G41(950,750) G43(1050,750) H2(-1000,700) H4(-900,700) H6(-800,700) H38(800,700) H40(900,700) H42(1000,700) J1(-1050,650) J3(-950,650) J5(-850,650) J7(-750,650) J37(750,650) J39(850,650) J41(950,650) J43(1050,650) K2(-1000,600) K4(-900,600) K6(-800,600) K38(800,600) K40(900,600) K42(1000,600) L1(-1050,550) L3(-950,550) L5(-850,550) L7(-750,550) L37(750,550) L39(850,550) L41(950,550) L43(1050,550) M2(-1000,500) M4(-900,500) M6(-800,500) M38(800,500) M40(900,500) M42(1000,500) N1(-1050,450) N3(-950,450) N5(-850,450) N7(-750,450) N37(750,450) N39(850,450) N41(950,450) N43(1050,450) P2(-1000,400) P4(-900,400) P6(-800,400) P38(800,400) P40(900,400) P42(1000,400) R1(-1050,350) R3(-950,350) R5(-850,350) R7(-750,350) R37(750,350) R39(850,350) R41(950,350) R43(1050,350) T2(-1000,300) T4(-900,300) T6(-800,300) T38(800,300) T40(900,300) T42(1000,300) U1(-1050,250) U3(-950,250) U5(-850,250) U7(-750,250) U37(750,250) U39(850,250) U41(950,250) U43(1050,250) V2(-1000,200) V4(-900,200) V6(-800,200) V38(800,200) V40(900,200) V42(1000,200) W1(-1050,150) W3(-950,150) W5(-850,150) W7(-750,150) W37(750,150) W39(850,150) W41(950,150) W43(1050,150) Y2(-1000,100) Y4(-900,100) Y6(-800,100) Y38(800,100) Y40(900,100) Y42(1000,100)